# Altium footprint library connector_degson.PcbLib: 59 footprints (part 4 of 4)
Each footprint in its own frame and in the unit in brackets; x right, y up, seen from the top. Pads: shape width x height; smd on the part's side, far side on the other; paste and mask are expansions set on the pad; w line width, h text height; cw(c..) or ccw(c..) is an arc to the next point about the centre after c.
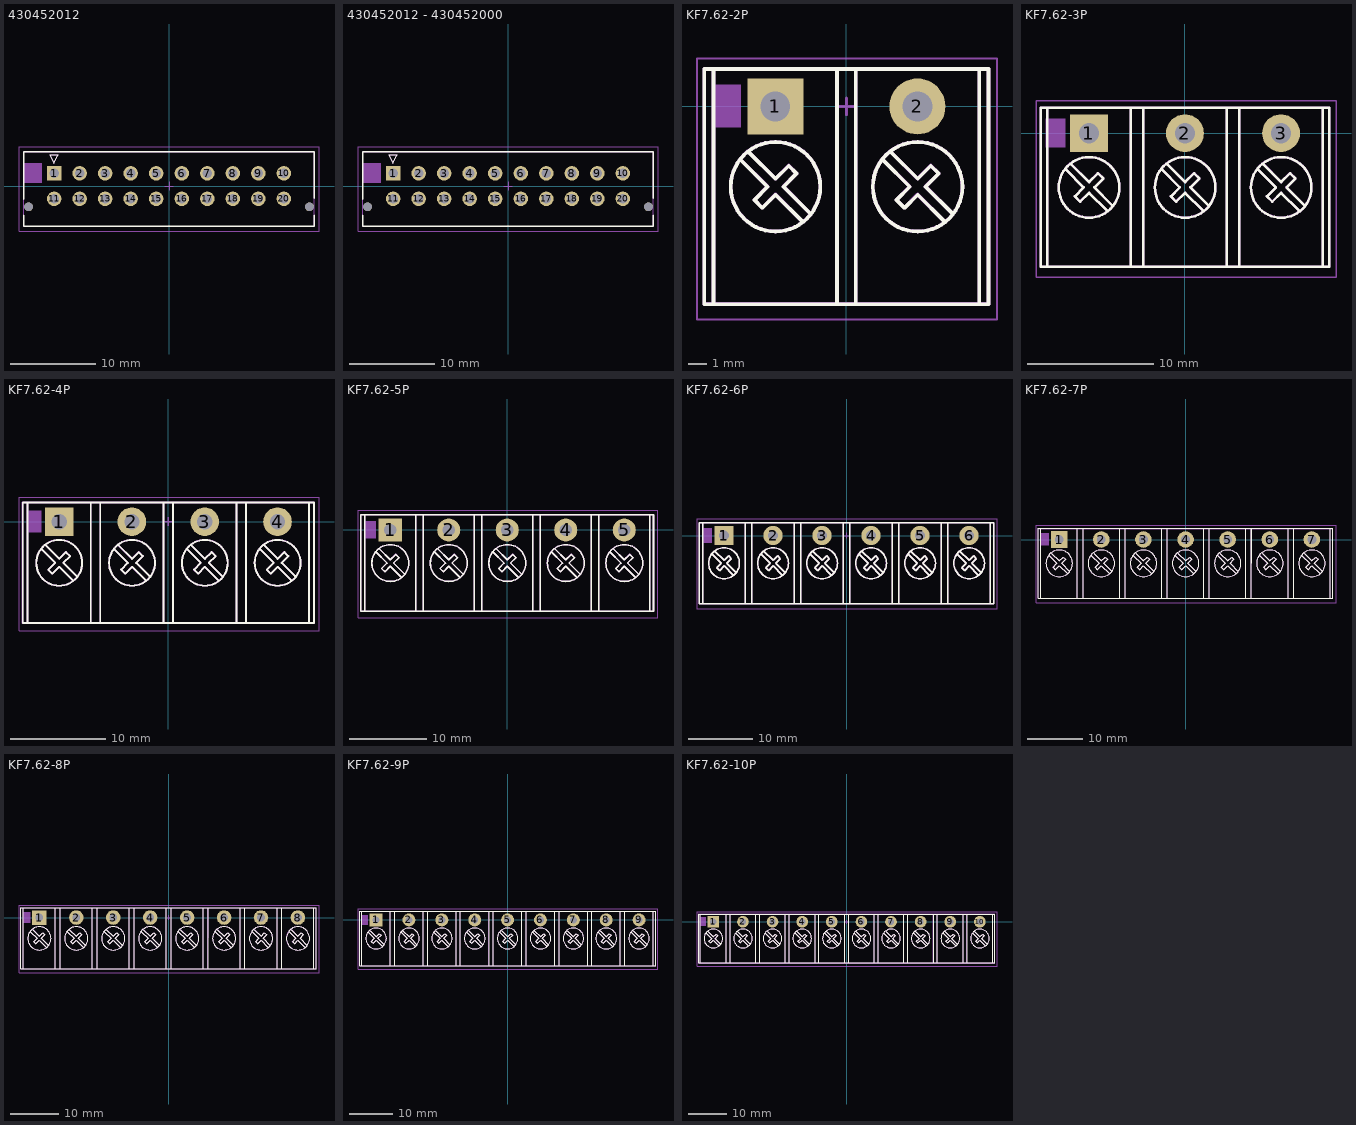
[diagram p3: the footprints below, top view; thin cyan lines are the x and y axes]

## 430452012 [mm] "Micro-Fit 3.0 Vertical Header, 3.00mm Pitch, Dual Row,  with PCB Polarizing Peg, 1.52µm Matte Tin Plating, Glow-Wire Capable, Black"
pads (22):
  rect 1.7x1.7 hole 1.1: 1(-13.5,1.5)
  round 1.7 hole 1.1: 2(-10.5,1.5) 3(-7.5,1.5) 4(-4.5,1.5) 5(-1.5,1.5) 6(1.5,1.5) 7(4.5,1.5) 8(7.5,1.5) 9(10.5,1.5) 10(13.5,1.5) 11(-13.5,-1.5) 12(-10.5,-1.5) 13(-7.5,-1.5) 14(-4.5,-1.5) 15(-1.5,-1.5) 16(1.5,-1.5) 17(4.5,-1.5) 18(7.5,-1.5) 19(10.5,-1.5) 20(13.5,-1.5)
  round 1.02 hole 1.02: 21(-16.5,-2.44) 22(16.5,-2.44)
Top Overlay:
  lines w0.127: -14.025,3.675 -13.525,2.675 -13.025,3.675 -14.025,3.675
  lines w0.2: -17.075,-3.45 -17.075,-4.725 17.075,-4.725 17.075,-3.45 ; -17.075,-1.525 -17.075,4.025 17.075,4.025 17.075,-1.42
Route Tool Path:
  text "%R" at -13.001,1.872 h1.27
Top Designator:
  text ".Designator" at -3.013,5.001 h0.6
Top Assembly:
  rectangle: -17.062,0.372 -14.904,2.678
  lines w0.127: -17.075,-4.75 17.075,-4.75 17.075,4.032 -17.075,4.032 -17.075,-4.75 ; -14.025,3.675 -13.525,2.675 -13.025,3.675 -14.025,3.675
Top Courtyard:
  lines w0.05: -17.625,-5.325 -17.625,4.625 17.625,4.625 17.625,-5.325 -17.625,-5.325
  lines w0.1: -0.5,0 0.5,0 ; 0,-0.5 0,0.5
3D body "0430452012.stp": height 10.05, standoff -3.04, extent -17.075,-4.83 17.075,3.94

## 430452012 - 430452000 [mm] "Micro-Fit 3.0 Vertical Header, 3.00mm Pitch, Dual Row,  with PCB Polarizing Peg, 1.52µm Matte Tin Plating, Glow-Wire Capable, Black"
pads (22):
  rect 1.7x1.7 hole 1.1: 1(-13.5,1.5)
  round 1.7 hole 1.1: 2(-10.5,1.5) 3(-7.5,1.5) 4(-4.5,1.5) 5(-1.5,1.5) 6(1.5,1.5) 7(4.5,1.5) 8(7.5,1.5) 9(10.5,1.5) 10(13.5,1.5) 11(-13.5,-1.5) 12(-10.5,-1.5) 13(-7.5,-1.5) 14(-4.5,-1.5) 15(-1.5,-1.5) 16(1.5,-1.5) 17(4.5,-1.5) 18(7.5,-1.5) 19(10.5,-1.5) 20(13.5,-1.5)
  round 1.02 hole 1.02: 21(-16.5,-2.44) 22(16.5,-2.44)
Top Overlay:
  lines w0.127: -14.025,3.675 -13.525,2.675 -13.025,3.675 -14.025,3.675
  lines w0.2: -17.075,-3.45 -17.075,-4.725 17.075,-4.725 17.075,-3.45 ; -17.075,-1.525 -17.075,4.025 17.075,4.025 17.075,-1.42
Route Tool Path:
  text "%R" at -13.001,1.872 h1.27
Top Designator:
  text ".Designator" at -3.013,5.001 h0.6
Top Assembly:
  rectangle: -17.062,0.372 -14.904,2.678
  lines w0.127: -17.075,-4.75 17.075,-4.75 17.075,4.032 -17.075,4.032 -17.075,-4.75 ; -14.025,3.675 -13.525,2.675 -13.025,3.675 -14.025,3.675
Top Courtyard:
  lines w0.05: -17.625,-5.325 -17.625,4.625 17.625,4.625 17.625,-5.325 -17.625,-5.325
  lines w0.1: -0.5,0 0.5,0 ; 0,-0.5 0,0.5
3D body "0430452012.stp": height 10.05, standoff -3.04, extent -17.075,-4.83 17.075,3.94
3D body "0430252000.stp": height 17.8, standoff 3.8, extent -15.43,-6.7 15.42,4.13

## KF7.62-2P [mm] "KF7.62-2P 24A 450V 7.62mm M3 Side Mount -40?~+105?"
height 12.6
pads (2):
  rect 3x3 hole 1.6: 1(-3.81,0)
  round 3 hole 1.6: 2(3.81,0)
Top Overlay:
  circle w0.2: c3.82,-4.308 r2.4
  circle w0.2: c-3.8,-4.308 r2.4
  lines w0.2: -7.12,-10.6 -7.12,2 ; -5.641,-2.897 -5.637,-2.895 -4.224,-4.308 -4.931,-5.015 -4.507,-5.439 -3.8,-4.732 -2.386,-6.147 ; -5.214,-2.47 -3.8,-3.884 -3.093,-3.177 -2.668,-3.601 -3.376,-4.308 -1.961,-5.722 ; -0.5,-10.6 -0.5,2 ; 0.5,-10.6 0.5,2 ; 1.979,-2.897 1.983,-2.895 3.396,-4.308 2.689,-5.015 3.113,-5.439 3.82,-4.732 5.234,-6.147 ; 2.406,-2.47 3.82,-3.884 4.527,-3.177 4.952,-3.601 4.244,-4.308 5.659,-5.722 ; 7.12,-10.6 7.12,2 ; -7.62,-10.6 -7.62,2 7.62,2 7.62,-10.6 -7.62,-10.6
Top Designator:
  text ".Designator" at -7.419,3.1 h0.6
Top Assembly:
  circle w0.2: c3.818,-4.301 r2.4
  circle w0.2: c-3.802,-4.301 r2.4
  rectangle: -7.242,-1.126 -5.662,1.18
  lines w0.1: -7.607,-10.604 -7.607,1.988 7.62,1.988 7.62,-10.604 -7.607,-10.604
  lines w0.2: -7.122,-10.592 -7.122,2.008 ; -5.643,-2.889 -5.639,-2.887 -4.226,-4.301 -4.933,-5.008 -4.509,-5.432 -3.802,-4.725 -2.387,-6.139 ; -5.216,-2.462 -3.802,-3.876 -3.094,-3.169 -2.67,-3.593 -3.377,-4.301 -1.963,-5.715 ; -0.502,-10.592 -0.502,2.008 ; 0.498,-10.592 0.498,2.008 ; 1.977,-2.889 1.981,-2.887 3.394,-4.301 2.687,-5.008 3.111,-5.432 3.818,-4.725 5.233,-6.139 ; 2.404,-2.462 3.818,-3.876 4.526,-3.169 4.95,-3.593 4.243,-4.301 5.657,-5.715 ; 7.118,-10.592 7.118,2.008 ; -7.622,-10.592 7.62,-10.592 7.62,2.008 -7.622,2.008 -7.622,-10.592
Top Courtyard:
  lines w0.1: -8.008,-11.43 -8.008,2.573 8.074,2.573 8.074,-11.424 -8.008,-11.424
  lines w0.15: -0.45,0 0.45,0 ; 0,-0.45 0,0.45
3D body "KF7.62-2P.step": height 12.5, standoff -3.9, extent -7.62,-10 7.62,2

## KF7.62-3P [mm] "KF7.62-3P 24A 450V 7.62mm M3 Side Mount -40?~+105?"
height 12.6
pads (3):
  rect 3x3 hole 1.6: 1(-7.62,0)
  round 3 hole 1.6: 2(0,0) 3(7.62,0)
Top Overlay:
  circle w0.2: c7.63,-4.308 r2.4
  circle w0.2: c0.01,-4.308 r2.4
  circle w0.2: c-7.61,-4.308 r2.4
  lines w0.2: -10.93,-10.6 -10.93,2 ; -9.451,-2.897 -9.447,-2.895 -8.034,-4.308 -8.741,-5.015 -8.317,-5.439 -7.61,-4.732 -6.196,-6.147 ; -9.024,-2.47 -7.61,-3.884 -6.903,-3.177 -6.478,-3.601 -7.186,-4.308 -5.771,-5.722 ; -4.31,-10.6 -4.31,2 ; -3.31,-10.6 -3.31,2 ; -1.831,-2.897 -1.827,-2.895 -0.414,-4.308 -1.121,-5.015 -0.697,-5.439 0.01,-4.732 1.424,-6.147 ; -1.404,-2.47 0.01,-3.884 0.717,-3.177 1.142,-3.601 0.434,-4.308 1.849,-5.722 ; 3.31,-10.6 3.31,2 ; 4.31,-10.6 4.31,2 ; 5.789,-2.897 5.793,-2.895 7.206,-4.308 6.499,-5.015 6.923,-5.439 7.63,-4.732 9.044,-6.147 ; 6.216,-2.47 7.63,-3.884 8.337,-3.177 8.762,-3.601 8.054,-4.308 9.469,-5.722 ; 10.93,-10.6 10.93,2 ; -11.43,-10.6 -11.43,2 11.43,2 11.43,-10.6 -11.43,-10.6
Top Designator:
  text ".Designator" at -11.229,3.1 h0.6
Top Assembly:
  circle w0.2: c7.628,-4.301 r2.4
  circle w0.2: c0.008,-4.301 r2.4
  circle w0.2: c-7.612,-4.301 r2.4
  rectangle: -11.052,-1.126 -9.472,1.18
  lines w0.1: -11.417,-10.604 -11.417,1.988 11.43,1.988 11.43,-10.604 -11.417,-10.604
  lines w0.2: -10.932,-10.592 -10.932,2.008 ; -9.453,-2.889 -9.449,-2.887 -8.036,-4.301 -8.743,-5.008 -8.319,-5.432 -7.612,-4.725 -6.197,-6.139 ; -9.026,-2.462 -7.612,-3.876 -6.904,-3.169 -6.48,-3.593 -7.187,-4.301 -5.773,-5.715 ; -4.312,-10.592 -4.312,2.008 ; -3.312,-10.592 -3.312,2.008 ; -1.833,-2.889 -1.829,-2.887 -0.416,-4.301 -1.123,-5.008 -0.699,-5.432 0.008,-4.725 1.423,-6.139 ; -1.406,-2.462 0.008,-3.876 0.716,-3.169 1.14,-3.593 0.433,-4.301 1.847,-5.715 ; 3.308,-10.592 3.308,2.008 ; 4.308,-10.592 4.308,2.008 ; 5.787,-2.889 5.791,-2.887 7.204,-4.301 6.497,-5.008 6.921,-5.432 7.628,-4.725 9.043,-6.139 ; 6.214,-2.462 7.628,-3.876 8.336,-3.169 8.76,-3.593 8.053,-4.301 9.467,-5.715 ; 10.928,-10.592 10.928,2.008 ; -11.432,-10.592 11.43,-10.592 11.43,2.008 -11.432,2.008 -11.432,-10.592
Top Courtyard:
  lines w0.1: -11.818,-11.43 -11.818,2.573 11.979,2.573 11.979,-11.424 -11.818,-11.424
  lines w0.15: -0.45,0 0.45,0 ; 0,-0.45 0,0.45
3D body "KF7.62-3P.step": height 12.5, standoff -3.9, extent -11.43,-10 11.43,2

## KF7.62-4P [mm] "KF7.62-4P 24A 450V 7.62mm M3 Side Mount -40?~+105?"
height 12.6
pads (4):
  rect 3x3 hole 1.6: 1(-11.43,0)
  round 3 hole 1.6: 2(-3.81,0) 3(3.81,0) 4(11.43,0)
Top Overlay:
  circle w0.2: c-11.42,-4.308 r2.4
  circle w0.2: c-3.8,-4.308 r2.4
  circle w0.2: c3.82,-4.308 r2.4
  circle w0.2: c11.44,-4.308 r2.4
  lines w0.2: -14.74,-10.6 -14.74,2 ; -13.261,-2.897 -13.257,-2.895 -11.844,-4.308 -12.551,-5.015 -12.127,-5.439 -11.42,-4.732 -10.006,-6.147 ; -12.834,-2.47 -11.42,-3.884 -10.713,-3.177 -10.288,-3.601 -10.996,-4.308 -9.581,-5.722 ; -8.12,-10.6 -8.12,2 ; -7.12,-10.6 -7.12,2 ; -5.641,-2.897 -5.637,-2.895 -4.224,-4.308 -4.931,-5.015 -4.507,-5.439 -3.8,-4.732 -2.386,-6.147 ; -5.214,-2.47 -3.8,-3.884 -3.093,-3.177 -2.668,-3.601 -3.376,-4.308 -1.961,-5.722 ; -0.5,-10.6 -0.5,2 ; 0.5,-10.6 0.5,2 ; 1.979,-2.897 1.983,-2.895 3.396,-4.308 2.689,-5.015 3.113,-5.439 3.82,-4.732 5.234,-6.147 ; 2.406,-2.47 3.82,-3.884 4.527,-3.177 4.952,-3.601 4.244,-4.308 5.659,-5.722 ; 7.12,-10.6 7.12,2 ; 8.12,-10.6 8.12,2 ; 9.599,-2.897 9.603,-2.895 11.016,-4.308 10.309,-5.015 10.733,-5.439 11.44,-4.732 12.854,-6.147 ; 10.026,-2.47 11.44,-3.884 12.147,-3.177 12.572,-3.601 11.864,-4.308 13.279,-5.722 ; 14.74,-10.6 14.74,2 ; 15.211,2 -15.24,2 -15.24,-10.6 15.227,-10.6 ; 15.24,-10.6 15.24,2
Top Designator:
  text ".Designator" at -15.039,3.1 h0.6
Top Assembly:
  circle w0.2: c-11.422,-4.301 r2.4
  circle w0.2: c-3.802,-4.301 r2.4
  circle w0.2: c3.818,-4.301 r2.4
  circle w0.2: c11.438,-4.301 r2.4
  rectangle: -14.862,-1.126 -13.282,1.18
  lines w0.1: 15.213,-10.604 -15.227,-10.604 -15.227,1.988 15.24,1.988 ; 15.262,-10.604 15.262,1.988
  lines w0.2: -14.742,-10.592 -14.742,2.008 ; -13.263,-2.889 -13.259,-2.887 -11.846,-4.301 -12.553,-5.008 -12.129,-5.432 -11.422,-4.725 -10.007,-6.139 ; -12.836,-2.462 -11.422,-3.876 -10.714,-3.169 -10.29,-3.593 -10.997,-4.301 -9.583,-5.715 ; -8.122,-10.592 -8.122,2.008 ; -7.122,-10.592 -7.122,2.008 ; -5.643,-2.889 -5.639,-2.887 -4.226,-4.301 -4.933,-5.008 -4.509,-5.432 -3.802,-4.725 -2.387,-6.139 ; -5.216,-2.462 -3.802,-3.876 -3.094,-3.169 -2.67,-3.593 -3.377,-4.301 -1.963,-5.715 ; -0.502,-10.592 -0.502,2.008 ; 0.498,-10.592 0.498,2.008 ; 1.977,-2.889 1.981,-2.887 3.394,-4.301 2.687,-5.008 3.111,-5.432 3.818,-4.725 5.233,-6.139 ; 2.404,-2.462 3.818,-3.876 4.526,-3.169 4.95,-3.593 4.243,-4.301 5.657,-5.715 ; 7.118,-10.592 7.118,2.008 ; 8.118,-10.592 8.118,2.008 ; 9.597,-2.889 9.601,-2.887 11.014,-4.301 10.307,-5.008 10.731,-5.432 11.438,-4.725 12.853,-6.139 ; 10.024,-2.462 11.438,-3.876 12.146,-3.169 12.57,-3.593 11.863,-4.301 13.277,-5.715 ; 14.738,-10.592 14.738,2.008 ; -15.242,-10.592 -15.242,2.008 15.24,2.008 15.24,-10.592 -15.242,-10.592
Top Courtyard:
  lines w0.1: -15.628,-11.43 -15.628,2.573 15.771,2.573 15.771,-11.424 -15.628,-11.424
  lines w0.15: -0.45,0 0.45,0 ; 0,-0.45 0,0.45
3D body "KF7.62-4P.step": height 12.5, standoff -3.9, extent -15.24,-10 15.24,2

## KF7.62-5P [mm] "KF7.62-5P 24A 450V 7.62mm M3 Side Mount -40?~+105?"
height 12.6
pads (5):
  rect 3x3 hole 1.6: 1(-15.24,0)
  round 3 hole 1.6: 2(-7.62,0) 3(0,0) 4(7.62,0) 5(15.24,0)
Top Overlay:
  circle w0.2: c15.25,-4.308 r2.4
  circle w0.2: c7.63,-4.308 r2.4
  circle w0.2: c0.01,-4.308 r2.4
  circle w0.2: c-7.61,-4.308 r2.4
  circle w0.2: c-15.23,-4.308 r2.4
  lines w0.2: -18.55,-10.6 -18.55,2 ; -17.071,-2.897 -17.067,-2.895 -15.654,-4.308 -16.361,-5.015 -15.937,-5.439 -15.23,-4.732 -13.816,-6.147 ; -16.644,-2.47 -15.23,-3.884 -14.523,-3.177 -14.098,-3.601 -14.806,-4.308 -13.391,-5.722 ; -11.93,-10.6 -11.93,2 ; -10.93,-10.6 -10.93,2 ; -9.451,-2.897 -9.447,-2.895 -8.034,-4.308 -8.741,-5.015 -8.317,-5.439 -7.61,-4.732 -6.196,-6.147 ; -9.024,-2.47 -7.61,-3.884 -6.903,-3.177 -6.478,-3.601 -7.186,-4.308 -5.771,-5.722 ; -4.31,-10.6 -4.31,2 ; -3.31,-10.6 -3.31,2 ; -1.831,-2.897 -1.827,-2.895 -0.414,-4.308 -1.121,-5.015 -0.697,-5.439 0.01,-4.732 1.424,-6.147 ; -1.404,-2.47 0.01,-3.884 0.717,-3.177 1.142,-3.601 0.434,-4.308 1.849,-5.722 ; 3.31,-10.6 3.31,2 ; 4.31,-10.6 4.31,2 ; 5.789,-2.897 5.793,-2.895 7.206,-4.308 6.499,-5.015 6.923,-5.439 7.63,-4.732 9.044,-6.147 ; 6.216,-2.47 7.63,-3.884 8.337,-3.177 8.762,-3.601 8.054,-4.308 9.469,-5.722 ; 10.93,-10.6 10.93,2 ; 11.93,-10.6 11.93,2 ; 13.409,-2.897 13.413,-2.895 14.826,-4.308 14.119,-5.015 14.543,-5.439 15.25,-4.732 16.664,-6.147 ; 13.836,-2.47 15.25,-3.884 15.957,-3.177 16.382,-3.601 15.674,-4.308 17.089,-5.722 ; -19.05,-10.6 -19.05,2 19.05,2 19.05,-10.6 -19.05,-10.6 ; 18.55,-10.6 18.55,2 18.55,-10.6
Top Designator:
  text ".Designator" at -18.849,3.1 h0.6
Top Assembly:
  circle w0.2: c7.628,-4.301 r2.4
  circle w0.2: c0.008,-4.301 r2.4
  circle w0.2: c-7.612,-4.301 r2.4
  circle w0.2: c15.248,-4.301 r2.4
  circle w0.2: c-15.232,-4.301 r2.4
  rectangle: -18.672,-1.126 -17.092,1.18
  lines w0.1: -19.037,-10.604 -19.037,1.988 19.05,1.988 19.05,-10.604 -19.037,-10.604
  lines w0.2: -18.552,-10.592 -18.552,2.008 ; -17.073,-2.889 -17.069,-2.887 -15.656,-4.301 -16.363,-5.008 -15.939,-5.432 -15.232,-4.725 -13.817,-6.139 ; -16.646,-2.462 -15.232,-3.876 -14.524,-3.169 -14.1,-3.593 -14.807,-4.301 -13.393,-5.715 ; -11.932,-10.592 -11.932,2.008 ; -10.932,-10.592 -10.932,2.008 ; -9.453,-2.889 -9.449,-2.887 -8.036,-4.301 -8.743,-5.008 -8.319,-5.432 -7.612,-4.725 -6.197,-6.139 ; -9.026,-2.462 -7.612,-3.876 -6.904,-3.169 -6.48,-3.593 -7.187,-4.301 -5.773,-5.715 ; -4.312,-10.592 -4.312,2.008 ; -3.312,-10.592 -3.312,2.008 ; -1.833,-2.889 -1.829,-2.887 -0.416,-4.301 -1.123,-5.008 -0.699,-5.432 0.008,-4.725 1.423,-6.139 ; -1.406,-2.462 0.008,-3.876 0.716,-3.169 1.14,-3.593 0.433,-4.301 1.847,-5.715 ; 3.308,-10.592 3.308,2.008 ; 4.308,-10.592 4.308,2.008 ; 5.787,-2.889 5.791,-2.887 7.204,-4.301 6.497,-5.008 6.921,-5.432 7.628,-4.725 9.043,-6.139 ; 6.214,-2.462 7.628,-3.876 8.336,-3.169 8.76,-3.593 8.053,-4.301 9.467,-5.715 ; 10.928,-10.592 10.928,2.008 ; 11.928,-10.592 11.928,2.008 ; 13.407,-2.889 13.411,-2.887 14.824,-4.301 14.117,-5.008 14.541,-5.432 15.248,-4.725 16.663,-6.139 ; 13.834,-2.462 15.248,-3.876 15.956,-3.169 16.38,-3.593 15.673,-4.301 17.087,-5.715 ; -19.052,-10.592 19.05,-10.592 19.05,2.008 -19.052,2.008 -19.052,-10.592 ; 18.548,-10.592 18.548,2.008 18.548,-10.592
Top Courtyard:
  lines w0.1: -19.438,-11.43 -19.438,2.573 19.634,2.573 19.634,-11.424 -19.438,-11.424
  lines w0.15: -0.45,0 0.45,0 ; 0,-0.45 0,0.45
3D body "KF7.62-5P.step": height 12.5, standoff -3.9, extent -19.05,-10 19.05,2

## KF7.62-6P [mm] "KF7.62-6P 24A 450V 7.62mm M3 Side Mount -40?~+105?"
height 12.6
pads (6):
  rect 3x3 hole 1.6: 1(-19.05,0)
  round 3 hole 1.6: 2(-11.43,0) 3(-3.81,0) 4(3.81,0) 5(11.43,0) 6(19.05,0)
Top Overlay:
  circle w0.2: c-19.04,-4.308 r2.4
  circle w0.2: c-11.42,-4.308 r2.4
  circle w0.2: c-3.8,-4.308 r2.4
  circle w0.2: c3.82,-4.308 r2.4
  circle w0.2: c11.44,-4.308 r2.4
  circle w0.2: c19.06,-4.308 r2.4
  lines w0.2: -22.36,-10.6 -22.36,2 ; -20.881,-2.897 -20.877,-2.895 -19.464,-4.308 -20.171,-5.015 -19.747,-5.439 -19.04,-4.732 -17.626,-6.147 ; -20.454,-2.47 -19.04,-3.884 -18.333,-3.177 -17.908,-3.601 -18.616,-4.308 -17.201,-5.722 ; -15.74,-10.6 -15.74,2 ; -14.74,-10.6 -14.74,2 ; -13.261,-2.897 -13.257,-2.895 -11.844,-4.308 -12.551,-5.015 -12.127,-5.439 -11.42,-4.732 -10.006,-6.147 ; -12.834,-2.47 -11.42,-3.884 -10.713,-3.177 -10.288,-3.601 -10.996,-4.308 -9.581,-5.722 ; -8.12,-10.6 -8.12,2 ; -7.12,-10.6 -7.12,2 ; -5.641,-2.897 -5.637,-2.895 -4.224,-4.308 -4.931,-5.015 -4.507,-5.439 -3.8,-4.732 -2.386,-6.147 ; -5.214,-2.47 -3.8,-3.884 -3.093,-3.177 -2.668,-3.601 -3.376,-4.308 -1.961,-5.722 ; -0.5,-10.6 -0.5,2 ; 0.5,-10.6 0.5,2 ; 1.979,-2.897 1.983,-2.895 3.396,-4.308 2.689,-5.015 3.113,-5.439 3.82,-4.732 5.234,-6.147 ; 2.406,-2.47 3.82,-3.884 4.527,-3.177 4.952,-3.601 4.244,-4.308 5.659,-5.722 ; 7.12,-10.6 7.12,2 ; 8.12,-10.6 8.12,2 ; 9.599,-2.897 9.603,-2.895 11.016,-4.308 10.309,-5.015 10.733,-5.439 11.44,-4.732 12.854,-6.147 ; 10.026,-2.47 11.44,-3.884 12.147,-3.177 12.572,-3.601 11.864,-4.308 13.279,-5.722 ; 15.74,2 15.74,-10.6 15.745,1.993 ; 17.219,-2.897 17.223,-2.895 18.636,-4.308 17.929,-5.015 18.353,-5.439 19.06,-4.732 20.474,-6.147 ; 17.646,-2.47 19.06,-3.884 19.767,-3.177 20.192,-3.601 19.484,-4.308 20.899,-5.722 ; 22.36,-10.6 22.36,2 ; -22.86,-10.6 22.86,-10.6 22.86,2 -22.86,2 -22.86,-10.6 ; 14.74,-10.6 14.74,2 14.74,-10.6
Top Designator:
  text ".Designator" at -22.659,3.1 h0.6
Top Assembly:
  circle w0.2: c-19.042,-4.301 r2.4
  circle w0.2: c11.438,-4.301 r2.4
  circle w0.2: c-11.422,-4.301 r2.4
  circle w0.2: c-3.802,-4.301 r2.4
  circle w0.2: c3.818,-4.301 r2.4
  circle w0.2: c19.058,-4.301 r2.4
  rectangle: -22.482,-1.126 -20.902,1.18
  lines w0.1: -22.847,-10.604 22.86,-10.604 22.86,1.988 -22.847,1.988 -22.847,-10.604
  lines w0.2: -22.362,-10.592 -22.362,2.008 ; -20.883,-2.889 -20.879,-2.887 -19.466,-4.301 -20.173,-5.008 -19.749,-5.432 -19.042,-4.725 -17.627,-6.139 ; -20.456,-2.462 -19.042,-3.876 -18.334,-3.169 -17.91,-3.593 -18.617,-4.301 -17.203,-5.715 ; -15.742,-10.592 -15.742,2.008 ; -14.742,-10.592 -14.742,2.008 ; -13.263,-2.889 -13.259,-2.887 -11.846,-4.301 -12.553,-5.008 -12.129,-5.432 -11.422,-4.725 -10.007,-6.139 ; -12.836,-2.462 -11.422,-3.876 -10.714,-3.169 -10.29,-3.593 -10.997,-4.301 -9.583,-5.715 ; -8.122,-10.592 -8.122,2.008 ; -7.122,-10.592 -7.122,2.008 ; -5.643,-2.889 -5.639,-2.887 -4.226,-4.301 -4.933,-5.008 -4.509,-5.432 -3.802,-4.725 -2.387,-6.139 ; -5.216,-2.462 -3.802,-3.876 -3.094,-3.169 -2.67,-3.593 -3.377,-4.301 -1.963,-5.715 ; -0.502,-10.592 -0.502,2.008 ; 0.498,-10.592 0.498,2.008 ; 1.977,-2.889 1.981,-2.887 3.394,-4.301 2.687,-5.008 3.111,-5.432 3.818,-4.725 5.233,-6.139 ; 2.404,-2.462 3.818,-3.876 4.526,-3.169 4.95,-3.593 4.243,-4.301 5.657,-5.715 ; 7.118,-10.592 7.118,2.008 ; 8.118,-10.592 8.118,2.008 ; 9.597,-2.889 9.601,-2.887 11.014,-4.301 10.307,-5.008 10.731,-5.432 11.438,-4.725 12.853,-6.139 ; 10.024,-2.462 11.438,-3.876 12.146,-3.169 12.57,-3.593 11.863,-4.301 13.277,-5.715 ; 15.738,2.008 15.738,-10.592 15.743,2.001 ; 17.217,-2.889 17.221,-2.887 18.634,-4.301 17.927,-5.008 18.351,-5.432 19.058,-4.725 20.473,-6.139 ; 17.644,-2.462 19.058,-3.876 19.766,-3.169 20.19,-3.593 19.483,-4.301 20.897,-5.715 ; 22.358,-10.592 22.358,2.008 ; -22.862,-10.592 -22.862,2.008 22.86,2.008 22.86,-10.592 -22.862,-10.592 ; 14.738,-10.592 14.738,2.008 14.738,-10.592
Top Courtyard:
  lines w0.1: -23.248,-11.43 -23.248,2.573 23.401,2.573 23.401,-11.424 -23.248,-11.424
  lines w0.15: -0.45,0 0.45,0 ; 0,-0.45 0,0.45
3D body "KF7.62-6P.step": height 12.5, standoff -3.9, extent -22.86,-10 22.86,2

## KF7.62-7P [mm] "KF7.62-7P 24A 450V 7.62mm M3 Side Mount -40?~+105?"
height 12.6
pads (7):
  rect 3x3 hole 1.6: 1(-22.86,0)
  round 3 hole 1.6: 2(-15.24,0) 3(-7.62,0) 4(0,0) 5(7.62,0) 6(15.24,0) 7(22.86,0)
Top Overlay:
  circle w0.2: c-22.85,-4.308 r2.4
  circle w0.2: c-15.23,-4.308 r2.4
  circle w0.2: c-7.61,-4.308 r2.4
  circle w0.2: c0.01,-4.308 r2.4
  circle w0.2: c7.63,-4.308 r2.4
  circle w0.2: c15.25,-4.308 r2.4
  circle w0.2: c22.87,-4.308 r2.4
  lines w0.2: -26.17,-10.6 -26.17,2 ; -24.691,-2.897 -24.687,-2.895 -23.274,-4.308 -23.981,-5.015 -23.557,-5.439 -22.85,-4.732 -21.436,-6.147 ; -24.264,-2.47 -22.85,-3.884 -22.143,-3.177 -21.718,-3.601 -22.426,-4.308 -21.011,-5.722 ; -19.55,-10.6 -19.55,2 ; -18.55,-10.6 -18.55,2 ; -17.071,-2.897 -17.067,-2.895 -15.654,-4.308 -16.361,-5.015 -15.937,-5.439 -15.23,-4.732 -13.816,-6.147 ; -16.644,-2.47 -15.23,-3.884 -14.523,-3.177 -14.098,-3.601 -14.806,-4.308 -13.391,-5.722 ; -11.93,-10.6 -11.93,2 ; -10.93,-10.6 -10.93,2 ; -9.451,-2.897 -9.447,-2.895 -8.034,-4.308 -8.741,-5.015 -8.317,-5.439 -7.61,-4.732 -6.196,-6.147 ; -9.024,-2.47 -7.61,-3.884 -6.903,-3.177 -6.478,-3.601 -7.186,-4.308 -5.771,-5.722 ; -4.31,-10.6 -4.31,2 ; -3.31,-10.6 -3.31,2 ; -1.831,-2.897 -1.827,-2.895 -0.414,-4.308 -1.121,-5.015 -0.697,-5.439 0.01,-4.732 1.424,-6.147 ; -1.404,-2.47 0.01,-3.884 0.717,-3.177 1.142,-3.601 0.434,-4.308 1.849,-5.722 ; 3.31,-10.6 3.31,2 ; 4.31,-10.6 4.31,2 ; 5.789,-2.897 5.793,-2.895 7.206,-4.308 6.499,-5.015 6.923,-5.439 7.63,-4.732 9.044,-6.147 ; 6.216,-2.47 7.63,-3.884 8.337,-3.177 8.762,-3.601 8.054,-4.308 9.469,-5.722 ; 11.93,2 11.93,-10.6 11.935,1.993 ; 13.409,-2.897 13.413,-2.895 14.826,-4.308 14.119,-5.015 14.543,-5.439 15.25,-4.732 16.664,-6.147 ; 13.836,-2.47 15.25,-3.884 15.957,-3.177 16.382,-3.601 15.674,-4.308 17.089,-5.722 ; 18.55,-10.6 18.55,2 ; 19.55,-10.6 19.55,2 ; 21.029,-2.897 21.033,-2.895 22.446,-4.308 21.739,-5.015 22.163,-5.439 22.87,-4.732 24.284,-6.147 ; 21.456,-2.47 22.87,-3.884 23.577,-3.177 24.002,-3.601 23.294,-4.308 24.709,-5.722 ; 26.17,-10.6 26.17,2 ; -26.67,-10.6 26.67,-10.6 26.67,2 -26.67,2 -26.67,-10.6 ; 10.93,-10.6 10.93,2 10.93,-10.6
Top Designator:
  text ".Designator" at -26.469,3.1 h0.6
Top Assembly:
  circle w0.2: c22.868,-4.301 r2.4
  circle w0.2: c-22.852,-4.301 r2.4
  circle w0.2: c7.628,-4.301 r2.4
  circle w0.2: c-15.232,-4.301 r2.4
  circle w0.2: c-7.612,-4.301 r2.4
  circle w0.2: c0.008,-4.301 r2.4
  circle w0.2: c15.248,-4.301 r2.4
  rectangle: -26.292,-1.126 -24.712,1.18
  lines w0.1: -26.657,-10.604 26.67,-10.604 26.67,1.988 -26.657,1.988 -26.657,-10.604
  lines w0.2: -26.172,-10.592 -26.172,2.008 ; -24.693,-2.889 -24.689,-2.887 -23.276,-4.301 -23.983,-5.008 -23.559,-5.432 -22.852,-4.725 -21.437,-6.139 ; -24.266,-2.462 -22.852,-3.876 -22.144,-3.169 -21.72,-3.593 -22.427,-4.301 -21.013,-5.715 ; -19.552,-10.592 -19.552,2.008 ; -18.552,-10.592 -18.552,2.008 ; -17.073,-2.889 -17.069,-2.887 -15.656,-4.301 -16.363,-5.008 -15.939,-5.432 -15.232,-4.725 -13.817,-6.139 ; -16.646,-2.462 -15.232,-3.876 -14.524,-3.169 -14.1,-3.593 -14.807,-4.301 -13.393,-5.715 ; -11.932,-10.592 -11.932,2.008 ; -10.932,-10.592 -10.932,2.008 ; -9.453,-2.889 -9.449,-2.887 -8.036,-4.301 -8.743,-5.008 -8.319,-5.432 -7.612,-4.725 -6.197,-6.139 ; -9.026,-2.462 -7.612,-3.876 -6.904,-3.169 -6.48,-3.593 -7.187,-4.301 -5.773,-5.715 ; -4.312,-10.592 -4.312,2.008 ; -3.312,-10.592 -3.312,2.008 ; -1.833,-2.889 -1.829,-2.887 -0.416,-4.301 -1.123,-5.008 -0.699,-5.432 0.008,-4.725 1.423,-6.139 ; -1.406,-2.462 0.008,-3.876 0.716,-3.169 1.14,-3.593 0.433,-4.301 1.847,-5.715 ; 3.308,-10.592 3.308,2.008 ; 4.308,-10.592 4.308,2.008 ; 5.787,-2.889 5.791,-2.887 7.204,-4.301 6.497,-5.008 6.921,-5.432 7.628,-4.725 9.043,-6.139 ; 6.214,-2.462 7.628,-3.876 8.336,-3.169 8.76,-3.593 8.053,-4.301 9.467,-5.715 ; 11.928,2.008 11.928,-10.592 11.933,2.001 ; 13.407,-2.889 13.411,-2.887 14.824,-4.301 14.117,-5.008 14.541,-5.432 15.248,-4.725 16.663,-6.139 ; 13.834,-2.462 15.248,-3.876 15.956,-3.169 16.38,-3.593 15.673,-4.301 17.087,-5.715 ; 18.548,-10.592 18.548,2.008 ; 19.548,-10.592 19.548,2.008 ; 21.027,-2.889 21.031,-2.887 22.444,-4.301 21.737,-5.008 22.161,-5.432 22.868,-4.725 24.283,-6.139 ; 21.454,-2.462 22.868,-3.876 23.576,-3.169 24,-3.593 23.293,-4.301 24.707,-5.715 ; 26.168,-10.592 26.168,2.008 ; -26.672,-10.592 -26.672,2.008 26.67,2.008 26.67,-10.592 -26.672,-10.592 ; 10.928,-10.592 10.928,2.008 10.928,-10.592
Top Courtyard:
  lines w0.1: -27.058,-11.43 -27.058,2.573 27.218,2.573 27.218,-11.424 -27.058,-11.424
  lines w0.15: -0.45,0 0.45,0 ; 0,-0.45 0,0.45
3D body "KF7.62-7P.step": height 12.5, standoff -3.9, extent -26.67,-10 26.67,2

## KF7.62-8P [mm] "KF7.62-8P 24A 450V 7.62mm M3 Side Mount -40?~+105?"
height 12.6
pads (8):
  rect 3x3 hole 1.6: 1(-26.67,0)
  round 3 hole 1.6: 2(-19.05,0) 3(-11.43,0) 4(-3.81,0) 5(3.81,0) 6(11.43,0) 7(19.05,0) 8(26.67,0)
Top Overlay:
  circle w0.2: c26.68,-4.308 r2.4
  circle w0.2: c19.06,-4.308 r2.4
  circle w0.2: c11.44,-4.308 r2.4
  circle w0.2: c3.82,-4.308 r2.4
  circle w0.2: c-3.8,-4.308 r2.4
  circle w0.2: c-11.42,-4.308 r2.4
  circle w0.2: c-19.04,-4.308 r2.4
  circle w0.2: c-26.66,-4.308 r2.4
  lines w0.2: -29.98,-10.6 -29.98,2 ; -28.501,-2.897 -28.497,-2.895 -27.084,-4.308 -27.791,-5.015 -27.367,-5.439 -26.66,-4.732 -25.246,-6.147 ; -28.074,-2.47 -26.66,-3.884 -25.953,-3.177 -25.528,-3.601 -26.236,-4.308 -24.821,-5.722 ; -23.36,-10.6 -23.36,2 ; -22.36,-10.6 -22.36,2 ; -20.881,-2.897 -20.877,-2.895 -19.464,-4.308 -20.171,-5.015 -19.747,-5.439 -19.04,-4.732 -17.626,-6.147 ; -20.454,-2.47 -19.04,-3.884 -18.333,-3.177 -17.908,-3.601 -18.616,-4.308 -17.201,-5.722 ; -15.74,-10.6 -15.74,2 ; -14.74,-10.6 -14.74,2 ; -13.261,-2.897 -13.257,-2.895 -11.844,-4.308 -12.551,-5.015 -12.127,-5.439 -11.42,-4.732 -10.006,-6.147 ; -12.834,-2.47 -11.42,-3.884 -10.713,-3.177 -10.288,-3.601 -10.996,-4.308 -9.581,-5.722 ; -8.12,-10.6 -8.12,2 ; -7.12,-10.6 -7.12,2 ; -5.641,-2.897 -5.637,-2.895 -4.224,-4.308 -4.931,-5.015 -4.507,-5.439 -3.8,-4.732 -2.386,-6.147 ; -5.214,-2.47 -3.8,-3.884 -3.093,-3.177 -2.668,-3.601 -3.376,-4.308 -1.961,-5.722 ; -0.5,-10.6 -0.5,2 ; 0.5,-10.6 0.5,2 ; 1.979,-2.897 1.983,-2.895 3.396,-4.308 2.689,-5.015 3.113,-5.439 3.82,-4.732 5.234,-6.147 ; 2.406,-2.47 3.82,-3.884 4.527,-3.177 4.952,-3.601 4.244,-4.308 5.659,-5.722 ; 8.12,2 8.12,-10.6 8.125,1.993 ; 9.599,-2.897 9.603,-2.895 11.016,-4.308 10.309,-5.015 10.733,-5.439 11.44,-4.732 12.854,-6.147 ; 10.026,-2.47 11.44,-3.884 12.147,-3.177 12.572,-3.601 11.864,-4.308 13.279,-5.722 ; 14.74,-10.6 14.74,2 ; 15.74,-10.6 15.74,2 ; 17.219,-2.897 17.223,-2.895 18.636,-4.308 17.929,-5.015 18.353,-5.439 19.06,-4.732 20.474,-6.147 ; 17.646,-2.47 19.06,-3.884 19.767,-3.177 20.192,-3.601 19.484,-4.308 20.899,-5.722 ; 22.36,-10.6 22.36,2 ; 23.36,-10.6 23.36,2 ; 24.839,-2.897 24.843,-2.895 26.256,-4.308 25.549,-5.015 25.973,-5.439 26.68,-4.732 28.094,-6.147 ; 25.266,-2.47 26.68,-3.884 27.387,-3.177 27.812,-3.601 27.104,-4.308 28.519,-5.722 ; 29.98,-10.6 29.98,2 ; -30.48,-10.6 -30.48,2 30.48,2 30.48,-10.6 -30.48,-10.6 ; 7.12,-10.6 7.12,2 7.12,-10.6
Top Designator:
  text ".Designator" at -30.279,3.1 h0.6
Top Assembly:
  circle w0.2: c11.438,-4.301 r2.4
  circle w0.2: c-3.802,-4.301 r2.4
  circle w0.2: c-11.422,-4.301 r2.4
  circle w0.2: c-19.042,-4.301 r2.4
  circle w0.2: c26.678,-4.301 r2.4
  circle w0.2: c3.818,-4.301 r2.4
  circle w0.2: c-26.662,-4.301 r2.4
  circle w0.2: c19.058,-4.301 r2.4
  rectangle: -30.102,-1.126 -28.522,1.18
  lines w0.1: -30.467,-10.604 -30.467,1.988 30.48,1.988 30.48,-10.604 -30.467,-10.604
  lines w0.2: -29.982,-10.592 -29.982,2.008 ; -28.503,-2.889 -28.499,-2.887 -27.086,-4.301 -27.793,-5.008 -27.369,-5.432 -26.662,-4.725 -25.247,-6.139 ; -28.076,-2.462 -26.662,-3.876 -25.954,-3.169 -25.53,-3.593 -26.237,-4.301 -24.823,-5.715 ; -23.362,-10.592 -23.362,2.008 ; -22.362,-10.592 -22.362,2.008 ; -20.883,-2.889 -20.879,-2.887 -19.466,-4.301 -20.173,-5.008 -19.749,-5.432 -19.042,-4.725 -17.627,-6.139 ; -20.456,-2.462 -19.042,-3.876 -18.334,-3.169 -17.91,-3.593 -18.617,-4.301 -17.203,-5.715 ; -15.742,-10.592 -15.742,2.008 ; -14.742,-10.592 -14.742,2.008 ; -13.263,-2.889 -13.259,-2.887 -11.846,-4.301 -12.553,-5.008 -12.129,-5.432 -11.422,-4.725 -10.007,-6.139 ; -12.836,-2.462 -11.422,-3.876 -10.714,-3.169 -10.29,-3.593 -10.997,-4.301 -9.583,-5.715 ; -8.122,-10.592 -8.122,2.008 ; -7.122,-10.592 -7.122,2.008 ; -5.643,-2.889 -5.639,-2.887 -4.226,-4.301 -4.933,-5.008 -4.509,-5.432 -3.802,-4.725 -2.387,-6.139 ; -5.216,-2.462 -3.802,-3.876 -3.094,-3.169 -2.67,-3.593 -3.377,-4.301 -1.963,-5.715 ; -0.502,-10.592 -0.502,2.008 ; 0.498,-10.592 0.498,2.008 ; 1.977,-2.889 1.981,-2.887 3.394,-4.301 2.687,-5.008 3.111,-5.432 3.818,-4.725 5.233,-6.139 ; 2.404,-2.462 3.818,-3.876 4.526,-3.169 4.95,-3.593 4.243,-4.301 5.657,-5.715 ; 8.118,2.008 8.118,-10.592 8.123,2.001 ; 9.597,-2.889 9.601,-2.887 11.014,-4.301 10.307,-5.008 10.731,-5.432 11.438,-4.725 12.853,-6.139 ; 10.024,-2.462 11.438,-3.876 12.146,-3.169 12.57,-3.593 11.863,-4.301 13.277,-5.715 ; 14.738,-10.592 14.738,2.008 ; 15.738,-10.592 15.738,2.008 ; 17.217,-2.889 17.221,-2.887 18.634,-4.301 17.927,-5.008 18.351,-5.432 19.058,-4.725 20.473,-6.139 ; 17.644,-2.462 19.058,-3.876 19.766,-3.169 20.19,-3.593 19.483,-4.301 20.897,-5.715 ; 22.358,-10.592 22.358,2.008 ; 23.358,-10.592 23.358,2.008 ; 24.837,-2.889 24.841,-2.887 26.254,-4.301 25.547,-5.008 25.971,-5.432 26.678,-4.725 28.093,-6.139 ; 25.264,-2.462 26.678,-3.876 27.386,-3.169 27.81,-3.593 27.103,-4.301 28.517,-5.715 ; 29.978,-10.592 29.978,2.008 ; -30.482,-10.592 30.48,-10.592 30.48,2.008 -30.482,2.008 -30.482,-10.592 ; 7.118,-10.592 7.118,2.008 7.118,-10.592
Top Courtyard:
  lines w0.1: -30.868,-11.43 -30.868,2.573 31.015,2.573 31.015,-11.424 -30.868,-11.424
  lines w0.15: -0.45,0 0.45,0 ; 0,-0.45 0,0.45
3D body "KF7.62-8P.step": height 12.5, standoff -3.9, extent -30.48,-10 30.48,2

## KF7.62-9P [mm] "KF7.62-9P 24A 450V 7.62mm M3 Side Mount -40?~+105?"
height 12.6
pads (9):
  rect 3x3 hole 1.6: 1(-30.48,0)
  round 3 hole 1.6: 2(-22.86,0) 3(-15.24,0) 4(-7.62,0) 5(0,0) 6(7.62,0) 7(15.24,0) 8(22.86,0) 9(30.48,0)
Top Overlay:
  circle w0.2: c30.49,-4.308 r2.4
  circle w0.2: c22.87,-4.308 r2.4
  circle w0.2: c15.25,-4.308 r2.4
  circle w0.2: c7.63,-4.308 r2.4
  circle w0.2: c0.01,-4.308 r2.4
  circle w0.2: c-7.61,-4.308 r2.4
  circle w0.2: c-15.23,-4.308 r2.4
  circle w0.2: c-22.85,-4.308 r2.4
  circle w0.2: c-30.47,-4.308 r2.4
  lines w0.2: -33.79,-10.6 -33.79,2 ; -32.311,-2.897 -32.307,-2.895 -30.894,-4.308 -31.601,-5.015 -31.177,-5.439 -30.47,-4.732 -29.056,-6.147 ; -31.884,-2.47 -30.47,-3.884 -29.763,-3.177 -29.338,-3.601 -30.046,-4.308 -28.631,-5.722 ; -27.17,-10.6 -27.17,2 ; -26.17,-10.6 -26.17,2 ; -24.691,-2.897 -24.687,-2.895 -23.274,-4.308 -23.981,-5.015 -23.557,-5.439 -22.85,-4.732 -21.436,-6.147 ; -24.264,-2.47 -22.85,-3.884 -22.143,-3.177 -21.718,-3.601 -22.426,-4.308 -21.011,-5.722 ; -19.55,-10.6 -19.55,2 ; -18.55,-10.6 -18.55,2 ; -17.071,-2.897 -17.067,-2.895 -15.654,-4.308 -16.361,-5.015 -15.937,-5.439 -15.23,-4.732 -13.816,-6.147 ; -16.644,-2.47 -15.23,-3.884 -14.523,-3.177 -14.098,-3.601 -14.806,-4.308 -13.391,-5.722 ; -11.93,-10.6 -11.93,2 ; -10.93,-10.6 -10.93,2 ; -9.451,-2.897 -9.447,-2.895 -8.034,-4.308 -8.741,-5.015 -8.317,-5.439 -7.61,-4.732 -6.196,-6.147 ; -9.024,-2.47 -7.61,-3.884 -6.903,-3.177 -6.478,-3.601 -7.186,-4.308 -5.771,-5.722 ; -4.31,-10.6 -4.31,2 ; -3.31,-10.6 -3.31,2 ; -1.831,-2.897 -1.827,-2.895 -0.414,-4.308 -1.121,-5.015 -0.697,-5.439 0.01,-4.732 1.424,-6.147 ; -1.404,-2.47 0.01,-3.884 0.717,-3.177 1.142,-3.601 0.434,-4.308 1.849,-5.722 ; 4.31,2 4.31,-10.6 4.315,1.993 ; 5.789,-2.897 5.793,-2.895 7.206,-4.308 6.499,-5.015 6.923,-5.439 7.63,-4.732 9.044,-6.147 ; 6.216,-2.47 7.63,-3.884 8.337,-3.177 8.762,-3.601 8.054,-4.308 9.469,-5.722 ; 10.93,-10.6 10.93,2 ; 11.93,-10.6 11.93,2 ; 13.409,-2.897 13.413,-2.895 14.826,-4.308 14.119,-5.015 14.543,-5.439 15.25,-4.732 16.664,-6.147 ; 13.836,-2.47 15.25,-3.884 15.957,-3.177 16.382,-3.601 15.674,-4.308 17.089,-5.722 ; 18.55,-10.6 18.55,2 ; 19.55,-10.6 19.55,2 ; 21.029,-2.897 21.033,-2.895 22.446,-4.308 21.739,-5.015 22.163,-5.439 22.87,-4.732 24.284,-6.147 ; 21.456,-2.47 22.87,-3.884 23.577,-3.177 24.002,-3.601 23.294,-4.308 24.709,-5.722 ; 26.17,-10.6 26.17,2 ; 27.17,-10.6 27.17,2 ; 28.649,-2.897 28.653,-2.895 30.066,-4.308 29.359,-5.015 29.783,-5.439 30.49,-4.732 31.904,-6.147 ; 29.076,-2.47 30.49,-3.884 31.197,-3.177 31.622,-3.601 30.914,-4.308 32.329,-5.722 ; 33.79,-10.6 33.79,2 ; -34.29,-10.6 -34.29,2 34.29,2 34.29,-10.6 -34.29,-10.6 ; 3.31,-10.6 3.31,2 3.31,-10.6
Top Designator:
  text ".Designator" at -34.089,3.1 h0.6
Top Assembly:
  circle w0.2: c7.628,-4.301 r2.4
  circle w0.2: c-7.612,-4.301 r2.4
  circle w0.2: c-15.232,-4.301 r2.4
  circle w0.2: c-22.852,-4.301 r2.4
  circle w0.2: c22.868,-4.301 r2.4
  circle w0.2: c0.008,-4.301 r2.4
  circle w0.2: c-30.472,-4.301 r2.4
  circle w0.2: c30.488,-4.301 r2.4
  circle w0.2: c15.248,-4.301 r2.4
  rectangle: -33.912,-1.126 -32.332,1.18
  lines w0.1: -34.277,-10.604 -34.277,1.988 34.29,1.988 34.29,-10.604 -34.277,-10.604
  lines w0.2: -33.792,-10.592 -33.792,2.008 ; -32.313,-2.889 -32.309,-2.887 -30.896,-4.301 -31.603,-5.008 -31.179,-5.432 -30.472,-4.725 -29.057,-6.139 ; -31.886,-2.462 -30.472,-3.876 -29.764,-3.169 -29.34,-3.593 -30.047,-4.301 -28.633,-5.715 ; -27.172,-10.592 -27.172,2.008 ; -26.172,-10.592 -26.172,2.008 ; -24.693,-2.889 -24.689,-2.887 -23.276,-4.301 -23.983,-5.008 -23.559,-5.432 -22.852,-4.725 -21.437,-6.139 ; -24.266,-2.462 -22.852,-3.876 -22.144,-3.169 -21.72,-3.593 -22.427,-4.301 -21.013,-5.715 ; -19.552,-10.592 -19.552,2.008 ; -18.552,-10.592 -18.552,2.008 ; -17.073,-2.889 -17.069,-2.887 -15.656,-4.301 -16.363,-5.008 -15.939,-5.432 -15.232,-4.725 -13.817,-6.139 ; -16.646,-2.462 -15.232,-3.876 -14.524,-3.169 -14.1,-3.593 -14.807,-4.301 -13.393,-5.715 ; -11.932,-10.592 -11.932,2.008 ; -10.932,-10.592 -10.932,2.008 ; -9.453,-2.889 -9.449,-2.887 -8.036,-4.301 -8.743,-5.008 -8.319,-5.432 -7.612,-4.725 -6.197,-6.139 ; -9.026,-2.462 -7.612,-3.876 -6.904,-3.169 -6.48,-3.593 -7.187,-4.301 -5.773,-5.715 ; -4.312,-10.592 -4.312,2.008 ; -3.312,-10.592 -3.312,2.008 ; -1.833,-2.889 -1.829,-2.887 -0.416,-4.301 -1.123,-5.008 -0.699,-5.432 0.008,-4.725 1.423,-6.139 ; -1.406,-2.462 0.008,-3.876 0.716,-3.169 1.14,-3.593 0.433,-4.301 1.847,-5.715 ; 4.308,2.008 4.308,-10.592 4.313,2.001 ; 5.787,-2.889 5.791,-2.887 7.204,-4.301 6.497,-5.008 6.921,-5.432 7.628,-4.725 9.043,-6.139 ; 6.214,-2.462 7.628,-3.876 8.336,-3.169 8.76,-3.593 8.053,-4.301 9.467,-5.715 ; 10.928,-10.592 10.928,2.008 ; 11.928,-10.592 11.928,2.008 ; 13.407,-2.889 13.411,-2.887 14.824,-4.301 14.117,-5.008 14.541,-5.432 15.248,-4.725 16.663,-6.139 ; 13.834,-2.462 15.248,-3.876 15.956,-3.169 16.38,-3.593 15.673,-4.301 17.087,-5.715 ; 18.548,-10.592 18.548,2.008 ; 19.548,-10.592 19.548,2.008 ; 21.027,-2.889 21.031,-2.887 22.444,-4.301 21.737,-5.008 22.161,-5.432 22.868,-4.725 24.283,-6.139 ; 21.454,-2.462 22.868,-3.876 23.576,-3.169 24,-3.593 23.293,-4.301 24.707,-5.715 ; 26.168,-10.592 26.168,2.008 ; 27.168,-10.592 27.168,2.008 ; 28.647,-2.889 28.651,-2.887 30.064,-4.301 29.357,-5.008 29.781,-5.432 30.488,-4.725 31.903,-6.139 ; 29.074,-2.462 30.488,-3.876 31.196,-3.169 31.62,-3.593 30.913,-4.301 32.327,-5.715 ; 33.788,-10.592 33.788,2.008 ; -34.292,-10.592 34.29,-10.592 34.29,2.008 -34.292,2.008 -34.292,-10.592 ; 3.308,-10.592 3.308,2.008 3.308,-10.592
Top Courtyard:
  lines w0.1: -34.678,-11.43 -34.678,2.573 34.866,2.573 34.866,-11.424 -34.678,-11.424
  lines w0.15: -0.45,0 0.45,0 ; 0,-0.45 0,0.45
3D body "KF7.62-9P.step": height 12.5, standoff -3.9, extent -34.29,-10 34.29,2

## KF7.62-10P [mm] "KF7.62-10P 24A 450V 7.62mm M3 Side Mount -40?~+105?"
height 12.6
pads (10):
  rect 3x3 hole 1.6: 1(-34.29,0)
  round 3 hole 1.6: 2(-26.67,0) 3(-19.05,0) 4(-11.43,0) 5(-3.81,0) 6(3.81,0) 7(11.43,0) 8(19.05,0) 9(26.67,0) 10(34.29,0)
Top Overlay:
  circle w0.2: c34.3,-4.308 r2.4
  circle w0.2: c26.68,-4.308 r2.4
  circle w0.2: c19.06,-4.308 r2.4
  circle w0.2: c11.44,-4.308 r2.4
  circle w0.2: c3.82,-4.308 r2.4
  circle w0.2: c-3.8,-4.308 r2.4
  circle w0.2: c-11.42,-4.308 r2.4
  circle w0.2: c-19.04,-4.308 r2.4
  circle w0.2: c-26.66,-4.308 r2.4
  circle w0.2: c-34.28,-4.308 r2.4
  lines w0.2: -37.6,-10.6 -37.6,2 ; -36.121,-2.897 -36.117,-2.895 -34.704,-4.308 -35.411,-5.015 -34.987,-5.439 -34.28,-4.732 -32.866,-6.147 ; -35.694,-2.47 -34.28,-3.884 -33.573,-3.177 -33.148,-3.601 -33.856,-4.308 -32.441,-5.722 ; -30.98,-10.6 -30.98,2 ; -29.98,-10.6 -29.98,2 ; -28.501,-2.897 -28.497,-2.895 -27.084,-4.308 -27.791,-5.015 -27.367,-5.439 -26.66,-4.732 -25.246,-6.147 ; -28.074,-2.47 -26.66,-3.884 -25.953,-3.177 -25.528,-3.601 -26.236,-4.308 -24.821,-5.722 ; -23.36,-10.6 -23.36,2 ; -22.36,-10.6 -22.36,2 ; -20.881,-2.897 -20.877,-2.895 -19.464,-4.308 -20.171,-5.015 -19.747,-5.439 -19.04,-4.732 -17.626,-6.147 ; -20.454,-2.47 -19.04,-3.884 -18.333,-3.177 -17.908,-3.601 -18.616,-4.308 -17.201,-5.722 ; -15.74,-10.6 -15.74,2 ; -14.74,-10.6 -14.74,2 ; -13.261,-2.897 -13.257,-2.895 -11.844,-4.308 -12.551,-5.015 -12.127,-5.439 -11.42,-4.732 -10.006,-6.147 ; -12.834,-2.47 -11.42,-3.884 -10.713,-3.177 -10.288,-3.601 -10.996,-4.308 -9.581,-5.722 ; -8.12,-10.6 -8.12,2 ; -7.12,-10.6 -7.12,2 ; -5.641,-2.897 -5.637,-2.895 -4.224,-4.308 -4.931,-5.015 -4.507,-5.439 -3.8,-4.732 -2.386,-6.147 ; -5.214,-2.47 -3.8,-3.884 -3.093,-3.177 -2.668,-3.601 -3.376,-4.308 -1.961,-5.722 ; 0.5,2 0.5,-10.6 0.505,1.993 ; 1.979,-2.897 1.983,-2.895 3.396,-4.308 2.689,-5.015 3.113,-5.439 3.82,-4.732 5.234,-6.147 ; 2.406,-2.47 3.82,-3.884 4.527,-3.177 4.952,-3.601 4.244,-4.308 5.659,-5.722 ; 7.12,-10.6 7.12,2 ; 8.12,-10.6 8.12,2 ; 9.599,-2.897 9.603,-2.895 11.016,-4.308 10.309,-5.015 10.733,-5.439 11.44,-4.732 12.854,-6.147 ; 10.026,-2.47 11.44,-3.884 12.147,-3.177 12.572,-3.601 11.864,-4.308 13.279,-5.722 ; 14.74,-10.6 14.74,2 ; 15.74,-10.6 15.74,2 ; 17.219,-2.897 17.223,-2.895 18.636,-4.308 17.929,-5.015 18.353,-5.439 19.06,-4.732 20.474,-6.147 ; 17.646,-2.47 19.06,-3.884 19.767,-3.177 20.192,-3.601 19.484,-4.308 20.899,-5.722 ; 22.36,-10.6 22.36,2 ; 23.36,-10.6 23.36,2 ; 24.839,-2.897 24.843,-2.895 26.256,-4.308 25.549,-5.015 25.973,-5.439 26.68,-4.732 28.094,-6.147 ; 25.266,-2.47 26.68,-3.884 27.387,-3.177 27.812,-3.601 27.104,-4.308 28.519,-5.722 ; 29.98,-10.6 29.98,2 ; 30.98,-10.6 30.98,2 ; 32.459,-2.897 32.463,-2.895 33.876,-4.308 33.169,-5.015 33.593,-5.439 34.3,-4.732 35.714,-6.147 ; 32.886,-2.47 34.3,-3.884 35.007,-3.177 35.432,-3.601 34.724,-4.308 36.139,-5.722 ; 37.6,-10.6 37.6,2 ; -38.1,-10.6 -38.1,2 38.1,2 38.1,-10.6 -38.1,-10.6 ; -0.5,-10.6 -0.5,2 -0.5,-10.6
Top Designator:
  text ".Designator" at -37.899,3.1 h0.6
Top Assembly:
  drawing of 151 lines, arcs and shapes, not listed
Top Courtyard:
  lines w0.1: -38.488,-11.43 -38.488,2.573 38.697,2.573 38.697,-11.43 ; -38.488,-11.424 38.697,-11.424
  lines w0.15: -0.45,0 0.45,0 ; 0,-0.45 0,0.45
3D body "KF7.62-10P.step": height 12.5, standoff -3.9, extent -38.1,-9.99 38.1,2.01